# Altium schematic symbol library jlcpcb_2025_04_capacitors_extended_0402.schlib: 3594 symbols (part 7 of 20) (continued)
## C1005X7R471KGTS
designator C?  Capacitance: 470pF  (hidden comment: *)
Capacitor, Ceramic (MLCC), 470pF, ±10%, 50V, X7R, ±10%, SMD 0402; Manufacturer: Darfon Elec; Manufacturer Part Number: C1005X7R471KGTS; Package Size: 0402; JLCPCB Basic Part: No; JLCPCB Part Number: C147529; Supplier 1: LCSC; Category: Capacitors - MLCC; Supplier Part Number 1: C147529; Tolerance: ±10%; Voltage Rating: 50V; Temperature Coefficient: X7R; RoHS: Yes; ComponentLink1Description: Datasheet; ComponentLink1URL: https://wmsc.lcsc.com/wmsc/upload/file/pdf/v2/lcsc/2304140030_Darfon-Elec-C1005X7R471KGTS_C147529.pdf; ComponentLink2Description: JLCPCB Part URL; ComponentLink2URL: https://jlcpcb.com/partdetail/C147529; ComponentLink3Description: LCSC Part URL; ComponentLink3URL: https://lcsc.com/product-detail/Multilayer-Ceramic-Capacitors-MLCC---SMD-SMT_Darfon-Elec-Darfon-Elec-C1005X7R471KGTS_C147529.html
footprint CAP-0402 (0402 (1005M) Capacitor)
pins: 1, 2

## C1005X7R471MGTS
designator C?  Capacitance: 470pF  (hidden comment: *)
Capacitor, Ceramic (MLCC), 470pF, ±20%, 50V, X7R, ±20%, SMD 0402; Manufacturer: Darfon Elec; Manufacturer Part Number: C1005X7R471MGTS; Package Size: 0402; JLCPCB Basic Part: No; JLCPCB Part Number: C267420; Supplier 1: LCSC; Category: Capacitors - MLCC; Supplier Part Number 1: C267420; Tolerance: ±20%; Voltage Rating: 50V; Temperature Coefficient: X7R; RoHS: Yes; ComponentLink1Description: Datasheet; ComponentLink1URL: https://wmsc.lcsc.com/wmsc/upload/file/pdf/v2/lcsc/2304140030_Darfon-Elec-C1005X7R471MGTS_C267420.pdf; ComponentLink2Description: JLCPCB Part URL; ComponentLink2URL: https://jlcpcb.com/partdetail/C267420; ComponentLink3Description: LCSC Part URL; ComponentLink3URL: https://lcsc.com/product-detail/Multilayer-Ceramic-Capacitors-MLCC---SMD-SMT_Darfon-Elec-Darfon-Elec-C1005X7R471MGTS_C267420.html
footprint CAP-0402 (0402 (1005M) Capacitor)
pins: 1, 2

## C1005X7R472KGT
designator C?  Capacitance: 4.7nF  (hidden comment: *)
Capacitor, Ceramic (MLCC), 4.7nF, ±10%, 50V, X7R, ±10%, SMD 0402; Manufacturer: Darfon Elec; Manufacturer Part Number: C1005X7R472KGT; Package Size: 0402; JLCPCB Basic Part: No; JLCPCB Part Number: C424339; Supplier 1: LCSC; Category: Capacitors - MLCC; Supplier Part Number 1: C424339; Tolerance: ±10%; Voltage Rating: 50V; Temperature Coefficient: X7R; RoHS: Yes; ComponentLink1Description: Datasheet; ComponentLink1URL: https://wmsc.lcsc.com/wmsc/upload/file/pdf/v2/lcsc/2304140030_Darfon-Elec-C1005X7R472KGT_C424339.pdf; ComponentLink2Description: JLCPCB Part URL; ComponentLink2URL: https://jlcpcb.com/partdetail/C424339; ComponentLink3Description: LCSC Part URL; ComponentLink3URL: https://lcsc.com/product-detail/Multilayer-Ceramic-Capacitors-MLCC---SMD-SMT_Darfon-Elec-Darfon-Elec-C1005X7R472KGT_C424339.html
footprint CAP-0402 (0402 (1005M) Capacitor)
pins: 1, 2

## C1005X7R472KGTS
designator C?  Capacitance: 4.7nF  (hidden comment: *)
Capacitor, Ceramic (MLCC), 4.7nF, ±10%, 50V, X7R, ±10%, SMD 0402; Manufacturer: Darfon Elec; Manufacturer Part Number: C1005X7R472KGTS; Package Size: 0402; JLCPCB Basic Part: No; JLCPCB Part Number: C147583; Supplier 1: LCSC; Category: Capacitors - MLCC; Supplier Part Number 1: C147583; Tolerance: ±10%; Voltage Rating: 50V; Temperature Coefficient: X7R; RoHS: Yes; ComponentLink1Description: Datasheet; ComponentLink1URL: https://wmsc.lcsc.com/wmsc/upload/file/pdf/v2/lcsc/2304140030_Darfon-Elec-C1005X7R472KGTS_C147583.pdf; ComponentLink2Description: JLCPCB Part URL; ComponentLink2URL: https://jlcpcb.com/partdetail/C147583; ComponentLink3Description: LCSC Part URL; ComponentLink3URL: https://lcsc.com/product-detail/Multilayer-Ceramic-Capacitors-MLCC---SMD-SMT_Darfon-Elec-Darfon-Elec-C1005X7R472KGTS_C147583.html
footprint CAP-0402 (0402 (1005M) Capacitor)
pins: 1, 2

## C1005X7R472MGTS
designator C?  Capacitance: 4.7nF  (hidden comment: *)
Capacitor, Ceramic (MLCC), 4.7nF, ±20%, 50V, X7R, ±20%, SMD 0402; Manufacturer: Darfon Elec; Manufacturer Part Number: C1005X7R472MGTS; Package Size: 0402; JLCPCB Basic Part: No; JLCPCB Part Number: C267421; Supplier 1: LCSC; Category: Capacitors - MLCC; Supplier Part Number 1: C267421; Tolerance: ±20%; Voltage Rating: 50V; Temperature Coefficient: X7R; RoHS: Yes; ComponentLink1Description: Datasheet; ComponentLink1URL: https://wmsc.lcsc.com/wmsc/upload/file/pdf/v2/lcsc/1810241814_Darfon-Elec-C1005X7R472MGTS_C267421.pdf; ComponentLink2Description: JLCPCB Part URL; ComponentLink2URL: https://jlcpcb.com/partdetail/C267421; ComponentLink3Description: LCSC Part URL; ComponentLink3URL: https://lcsc.com/product-detail/Multilayer-Ceramic-Capacitors-MLCC---SMD-SMT_Darfon-Elec-Darfon-Elec-C1005X7R472MGTS_C267421.html
footprint CAP-0402 (0402 (1005M) Capacitor)
pins: 1, 2

## C1005X7R473KETS
designator C?  Capacitance: 47nF  (hidden comment: *)
Capacitor, Ceramic (MLCC), 47nF, ±10%, 16V, X7R, ±10%, SMD 0402; Manufacturer: Darfon Elec; Manufacturer Part Number: C1005X7R473KETS; Package Size: 0402; JLCPCB Basic Part: No; JLCPCB Part Number: C147628; Supplier 1: LCSC; Category: Capacitors - MLCC; Supplier Part Number 1: C147628; Tolerance: ±10%; Voltage Rating: 16V; Temperature Coefficient: X7R; RoHS: Yes; ComponentLink1Description: Datasheet; ComponentLink1URL: https://wmsc.lcsc.com/wmsc/upload/file/pdf/v2/lcsc/2304140030_Darfon-Elec-C1005X7R473KETS_C147628.pdf; ComponentLink2Description: JLCPCB Part URL; ComponentLink2URL: https://jlcpcb.com/partdetail/C147628; ComponentLink3Description: LCSC Part URL; ComponentLink3URL: https://lcsc.com/product-detail/Multilayer-Ceramic-Capacitors-MLCC---SMD-SMT_Darfon-Elec-Darfon-Elec-C1005X7R473KETS_C147628.html
footprint CAP-0402 (0402 (1005M) Capacitor)
pins: 1, 2

## C1005X7R473METS
designator C?  Capacitance: 47nF  (hidden comment: *)
Capacitor, Ceramic (MLCC), 47nF, ±20%, 16V, X7R, ±20%, SMD 0402; Manufacturer: Darfon Elec; Manufacturer Part Number: C1005X7R473METS; Package Size: 0402; JLCPCB Basic Part: No; JLCPCB Part Number: C312032; Supplier 1: LCSC; Category: Capacitors - MLCC; Supplier Part Number 1: C312032; Tolerance: ±20%; Voltage Rating: 16V; Temperature Coefficient: X7R; RoHS: Yes; ComponentLink1Description: Datasheet; ComponentLink1URL: https://wmsc.lcsc.com/wmsc/upload/file/pdf/v2/lcsc/2304140030_Darfon-Elec-C1005X7R473METS_C312032.pdf; ComponentLink2Description: JLCPCB Part URL; ComponentLink2URL: https://jlcpcb.com/partdetail/C312032; ComponentLink3Description: LCSC Part URL; ComponentLink3URL: https://lcsc.com/product-detail/Multilayer-Ceramic-Capacitors-MLCC---SMD-SMT_Darfon-Elec-Darfon-Elec-C1005X7R473METS_C312032.html
footprint CAP-0402 (0402 (1005M) Capacitor)
pins: 1, 2

## C1005X7R473MFTS
designator C?  Capacitance: 47nF  (hidden comment: *)
Capacitor, Ceramic (MLCC), 47nF, ±20%, 25V, X7R, ±20%, SMD 0402; Manufacturer: Darfon Elec; Manufacturer Part Number: C1005X7R473MFTS; Package Size: 0402; JLCPCB Basic Part: No; JLCPCB Part Number: C311886; Supplier 1: LCSC; Category: Capacitors - MLCC; Supplier Part Number 1: C311886; Tolerance: ±20%; Voltage Rating: 25V; Temperature Coefficient: X7R; RoHS: Yes; ComponentLink1Description: Datasheet; ComponentLink1URL: https://wmsc.lcsc.com/wmsc/upload/file/pdf/v2/lcsc/2304140030_Darfon-Elec-C1005X7R473MFTS_C311886.pdf; ComponentLink2Description: JLCPCB Part URL; ComponentLink2URL: https://jlcpcb.com/partdetail/C311886; ComponentLink3Description: LCSC Part URL; ComponentLink3URL: https://lcsc.com/product-detail/Multilayer-Ceramic-Capacitors-MLCC---SMD-SMT_Darfon-Elec-Darfon-Elec-C1005X7R473MFTS_C311886.html
footprint CAP-0402 (0402 (1005M) Capacitor)
pins: 1, 2

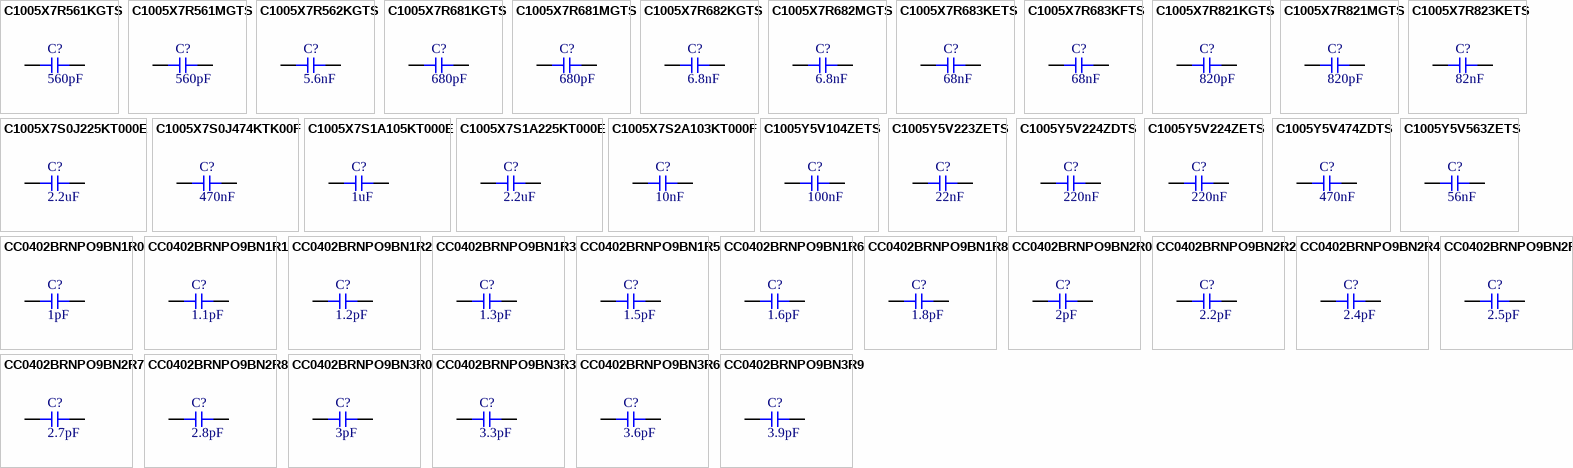
[diagram p29: symbols C1005X7R561KGTS to CC0402BRNPO9BN3R9]

## C1005X7R561KGTS
designator C?  Capacitance: 560pF  (hidden comment: *)
Capacitor, Ceramic (MLCC), 560pF, ±10%, 50V, X7R, ±10%, SMD 0402; Manufacturer: Darfon Elec; Manufacturer Part Number: C1005X7R561KGTS; Package Size: 0402; JLCPCB Basic Part: No; JLCPCB Part Number: C147533; Supplier 1: LCSC; Category: Capacitors - MLCC; Supplier Part Number 1: C147533; Tolerance: ±10%; Voltage Rating: 50V; Temperature Coefficient: X7R; RoHS: Yes; ComponentLink1Description: Datasheet; ComponentLink1URL: https://wmsc.lcsc.com/wmsc/upload/file/pdf/v2/lcsc/2304140030_Darfon-Elec-C1005X7R561KGTS_C147533.pdf; ComponentLink2Description: JLCPCB Part URL; ComponentLink2URL: https://jlcpcb.com/partdetail/C147533; ComponentLink3Description: LCSC Part URL; ComponentLink3URL: https://lcsc.com/product-detail/Multilayer-Ceramic-Capacitors-MLCC---SMD-SMT_Darfon-Elec-Darfon-Elec-C1005X7R561KGTS_C147533.html
footprint CAP-0402 (0402 (1005M) Capacitor)
pins: 1, 2

## C1005X7R561MGTS
designator C?  Capacitance: 560pF  (hidden comment: *)
Capacitor, Ceramic (MLCC), 560pF, ±20%, 50V, X7R, ±20%, SMD 0402; Manufacturer: Darfon Elec; Manufacturer Part Number: C1005X7R561MGTS; Package Size: 0402; JLCPCB Basic Part: No; JLCPCB Part Number: C311874; Supplier 1: LCSC; Category: Capacitors - MLCC; Supplier Part Number 1: C311874; Tolerance: ±20%; Voltage Rating: 50V; Temperature Coefficient: X7R; RoHS: Yes; ComponentLink1Description: Datasheet; ComponentLink1URL: https://wmsc.lcsc.com/wmsc/upload/file/pdf/v2/lcsc/2304140030_Darfon-Elec-C1005X7R561MGTS_C311874.pdf; ComponentLink2Description: JLCPCB Part URL; ComponentLink2URL: https://jlcpcb.com/partdetail/C311874; ComponentLink3Description: LCSC Part URL; ComponentLink3URL: https://lcsc.com/product-detail/Multilayer-Ceramic-Capacitors-MLCC---SMD-SMT_Darfon-Elec-Darfon-Elec-C1005X7R561MGTS_C311874.html
footprint CAP-0402 (0402 (1005M) Capacitor)
pins: 1, 2

## C1005X7R562KGTS
designator C?  Capacitance: 5.6nF  (hidden comment: *)
Capacitor, Ceramic (MLCC), 5.6nF, ±10%, 50V, X7R, ±10%, SMD 0402; Manufacturer: Darfon Elec; Manufacturer Part Number: C1005X7R562KGTS; Package Size: 0402; JLCPCB Basic Part: No; JLCPCB Part Number: C147587; Supplier 1: LCSC; Category: Capacitors - MLCC; Supplier Part Number 1: C147587; Tolerance: ±10%; Voltage Rating: 50V; Temperature Coefficient: X7R; RoHS: Yes; ComponentLink1Description: Datasheet; ComponentLink1URL: https://wmsc.lcsc.com/wmsc/upload/file/pdf/v2/lcsc/2304140030_Darfon-Elec-C1005X7R562KGTS_C147587.pdf; ComponentLink2Description: JLCPCB Part URL; ComponentLink2URL: https://jlcpcb.com/partdetail/C147587; ComponentLink3Description: LCSC Part URL; ComponentLink3URL: https://lcsc.com/product-detail/Multilayer-Ceramic-Capacitors-MLCC---SMD-SMT_Darfon-Elec-Darfon-Elec-C1005X7R562KGTS_C147587.html
footprint CAP-0402 (0402 (1005M) Capacitor)
pins: 1, 2

## C1005X7R681KGTS
designator C?  Capacitance: 680pF  (hidden comment: *)
Capacitor, Ceramic (MLCC), 680pF, ±10%, 50V, X7R, ±10%, SMD 0402; Manufacturer: Darfon Elec; Manufacturer Part Number: C1005X7R681KGTS; Package Size: 0402; JLCPCB Basic Part: No; JLCPCB Part Number: C147537; Supplier 1: LCSC; Category: Capacitors - MLCC; Supplier Part Number 1: C147537; Tolerance: ±10%; Voltage Rating: 50V; Temperature Coefficient: X7R; RoHS: Yes; ComponentLink1Description: Datasheet; ComponentLink1URL: https://wmsc.lcsc.com/wmsc/upload/file/pdf/v2/lcsc/2304140030_Darfon-Elec-C1005X7R681KGTS_C147537.pdf; ComponentLink2Description: JLCPCB Part URL; ComponentLink2URL: https://jlcpcb.com/partdetail/C147537; ComponentLink3Description: LCSC Part URL; ComponentLink3URL: https://lcsc.com/product-detail/Multilayer-Ceramic-Capacitors-MLCC---SMD-SMT_Darfon-Elec-Darfon-Elec-C1005X7R681KGTS_C147537.html
footprint CAP-0402 (0402 (1005M) Capacitor)
pins: 1, 2

## C1005X7R681MGTS
designator C?  Capacitance: 680pF  (hidden comment: *)
Capacitor, Ceramic (MLCC), 680pF, ±20%, 50V, X7R, ±20%, SMD 0402; Manufacturer: Darfon Elec; Manufacturer Part Number: C1005X7R681MGTS; Package Size: 0402; JLCPCB Basic Part: No; JLCPCB Part Number: C311864; Supplier 1: LCSC; Category: Capacitors - MLCC; Supplier Part Number 1: C311864; Tolerance: ±20%; Voltage Rating: 50V; Temperature Coefficient: X7R; RoHS: Yes; ComponentLink1Description: Datasheet; ComponentLink1URL: https://wmsc.lcsc.com/wmsc/upload/file/pdf/v2/lcsc/2304140030_Darfon-Elec-C1005X7R681MGTS_C311864.pdf; ComponentLink2Description: JLCPCB Part URL; ComponentLink2URL: https://jlcpcb.com/partdetail/C311864; ComponentLink3Description: LCSC Part URL; ComponentLink3URL: https://lcsc.com/product-detail/Multilayer-Ceramic-Capacitors-MLCC---SMD-SMT_Darfon-Elec-Darfon-Elec-C1005X7R681MGTS_C311864.html
footprint CAP-0402 (0402 (1005M) Capacitor)
pins: 1, 2

## C1005X7R682KGTS
designator C?  Capacitance: 6.8nF  (hidden comment: *)
Capacitor, Ceramic (MLCC), 6.8nF, ±10%, 50V, X7R, ±10%, SMD 0402; Manufacturer: Darfon Elec; Manufacturer Part Number: C1005X7R682KGTS; Package Size: 0402; JLCPCB Basic Part: No; JLCPCB Part Number: C147591; Supplier 1: LCSC; Category: Capacitors - MLCC; Supplier Part Number 1: C147591; Tolerance: ±10%; Voltage Rating: 50V; Temperature Coefficient: X7R; RoHS: Yes; ComponentLink1Description: Datasheet; ComponentLink1URL: https://wmsc.lcsc.com/wmsc/upload/file/pdf/v2/lcsc/2304140030_Darfon-Elec-C1005X7R682KGTS_C147591.pdf; ComponentLink2Description: JLCPCB Part URL; ComponentLink2URL: https://jlcpcb.com/partdetail/C147591; ComponentLink3Description: LCSC Part URL; ComponentLink3URL: https://lcsc.com/product-detail/Multilayer-Ceramic-Capacitors-MLCC---SMD-SMT_Darfon-Elec-Darfon-Elec-C1005X7R682KGTS_C147591.html
footprint CAP-0402 (0402 (1005M) Capacitor)
pins: 1, 2

## C1005X7R682MGTS
designator C?  Capacitance: 6.8nF  (hidden comment: *)
Capacitor, Ceramic (MLCC), 6.8nF, ±20%, 50V, X7R, ±20%, SMD 0402; Manufacturer: Darfon Elec; Manufacturer Part Number: C1005X7R682MGTS; Package Size: 0402; JLCPCB Basic Part: No; JLCPCB Part Number: C267422; Supplier 1: LCSC; Category: Capacitors - MLCC; Supplier Part Number 1: C267422; Tolerance: ±20%; Voltage Rating: 50V; Temperature Coefficient: X7R; RoHS: Yes; ComponentLink1Description: Datasheet; ComponentLink1URL: https://wmsc.lcsc.com/wmsc/upload/file/pdf/v2/lcsc/2304140030_Darfon-Elec-C1005X7R682MGTS_C267422.pdf; ComponentLink2Description: JLCPCB Part URL; ComponentLink2URL: https://jlcpcb.com/partdetail/C267422; ComponentLink3Description: LCSC Part URL; ComponentLink3URL: https://lcsc.com/product-detail/Multilayer-Ceramic-Capacitors-MLCC---SMD-SMT_Darfon-Elec-Darfon-Elec-C1005X7R682MGTS_C267422.html
footprint CAP-0402 (0402 (1005M) Capacitor)
pins: 1, 2

## C1005X7R683KETS
designator C?  Capacitance: 68nF  (hidden comment: *)
Capacitor, Ceramic (MLCC), 68nF, ±10%, 16V, X7R, ±10%, SMD 0402; Manufacturer: Darfon Elec; Manufacturer Part Number: C1005X7R683KETS; Package Size: 0402; JLCPCB Basic Part: No; JLCPCB Part Number: C147635; Supplier 1: LCSC; Category: Capacitors - MLCC; Supplier Part Number 1: C147635; Tolerance: ±10%; Voltage Rating: 16V; Temperature Coefficient: X7R; RoHS: Yes; ComponentLink1Description: Datasheet; ComponentLink1URL: https://wmsc.lcsc.com/wmsc/upload/file/pdf/v2/lcsc/2304140030_Darfon-Elec-C1005X7R683KETS_C147635.pdf; ComponentLink2Description: JLCPCB Part URL; ComponentLink2URL: https://jlcpcb.com/partdetail/C147635; ComponentLink3Description: LCSC Part URL; ComponentLink3URL: https://lcsc.com/product-detail/Multilayer-Ceramic-Capacitors-MLCC---SMD-SMT_Darfon-Elec-Darfon-Elec-C1005X7R683KETS_C147635.html
footprint CAP-0402 (0402 (1005M) Capacitor)
pins: 1, 2

## C1005X7R683KFTS
designator C?  Capacitance: 68nF  (hidden comment: *)
Capacitor, Ceramic (MLCC), 68nF, ±10%, 25V, X7R, ±10%, SMD 0402; Manufacturer: Darfon Elec; Manufacturer Part Number: C1005X7R683KFTS; Package Size: 0402; JLCPCB Basic Part: No; JLCPCB Part Number: C359307; Supplier 1: LCSC; Category: Capacitors - MLCC; Supplier Part Number 1: C359307; Tolerance: ±10%; Voltage Rating: 25V; Temperature Coefficient: X7R; RoHS: Yes; ComponentLink1Description: Datasheet; ComponentLink1URL: https://wmsc.lcsc.com/wmsc/upload/file/pdf/v2/lcsc/2304140030_Darfon-Elec-C1005X7R683KFTS_C359307.pdf; ComponentLink2Description: JLCPCB Part URL; ComponentLink2URL: https://jlcpcb.com/partdetail/C359307; ComponentLink3Description: LCSC Part URL; ComponentLink3URL: https://lcsc.com/product-detail/Multilayer-Ceramic-Capacitors-MLCC---SMD-SMT_Darfon-Elec-Darfon-Elec-C1005X7R683KFTS_C359307.html
footprint CAP-0402 (0402 (1005M) Capacitor)
pins: 1, 2

## C1005X7R821KGTS
designator C?  Capacitance: 820pF  (hidden comment: *)
Capacitor, Ceramic (MLCC), 820pF, ±10%, 50V, X7R, ±10%, SMD 0402; Manufacturer: Darfon Elec; Manufacturer Part Number: C1005X7R821KGTS; Package Size: 0402; JLCPCB Basic Part: No; JLCPCB Part Number: C147541; Supplier 1: LCSC; Category: Capacitors - MLCC; Supplier Part Number 1: C147541; Tolerance: ±10%; Voltage Rating: 50V; Temperature Coefficient: X7R; RoHS: Yes; ComponentLink1Description: Datasheet; ComponentLink1URL: https://wmsc.lcsc.com/wmsc/upload/file/pdf/v2/lcsc/2304140030_Darfon-Elec-C1005X7R821KGTS_C147541.pdf; ComponentLink2Description: JLCPCB Part URL; ComponentLink2URL: https://jlcpcb.com/partdetail/C147541; ComponentLink3Description: LCSC Part URL; ComponentLink3URL: https://lcsc.com/product-detail/Multilayer-Ceramic-Capacitors-MLCC---SMD-SMT_Darfon-Elec-Darfon-Elec-C1005X7R821KGTS_C147541.html
footprint CAP-0402 (0402 (1005M) Capacitor)
pins: 1, 2

## C1005X7R821MGTS
designator C?  Capacitance: 820pF  (hidden comment: *)
Capacitor, Ceramic (MLCC), 820pF, ±20%, 50V, X7R, ±20%, SMD 0402; Manufacturer: Darfon Elec; Manufacturer Part Number: C1005X7R821MGTS; Package Size: 0402; JLCPCB Basic Part: No; JLCPCB Part Number: C311844; Supplier 1: LCSC; Category: Capacitors - MLCC; Supplier Part Number 1: C311844; Tolerance: ±20%; Voltage Rating: 50V; Temperature Coefficient: X7R; RoHS: Yes; ComponentLink1Description: Datasheet; ComponentLink1URL: https://wmsc.lcsc.com/wmsc/upload/file/pdf/v2/lcsc/2304140030_Darfon-Elec-C1005X7R821MGTS_C311844.pdf; ComponentLink2Description: JLCPCB Part URL; ComponentLink2URL: https://jlcpcb.com/partdetail/C311844; ComponentLink3Description: LCSC Part URL; ComponentLink3URL: https://lcsc.com/product-detail/Multilayer-Ceramic-Capacitors-MLCC---SMD-SMT_Darfon-Elec-Darfon-Elec-C1005X7R821MGTS_C311844.html
footprint CAP-0402 (0402 (1005M) Capacitor)
pins: 1, 2

## C1005X7R823KETS
designator C?  Capacitance: 82nF  (hidden comment: *)
Capacitor, Ceramic (MLCC), 82nF, ±10%, 16V, X7R, ±10%, SMD 0402; Manufacturer: Darfon Elec; Manufacturer Part Number: C1005X7R823KETS; Package Size: 0402; JLCPCB Basic Part: No; JLCPCB Part Number: C147637; Supplier 1: LCSC; Category: Capacitors - MLCC; Supplier Part Number 1: C147637; Tolerance: ±10%; Voltage Rating: 16V; Temperature Coefficient: X7R; RoHS: Yes; ComponentLink1Description: Datasheet; ComponentLink1URL: https://wmsc.lcsc.com/wmsc/upload/file/pdf/v2/lcsc/2304140030_Darfon-Elec-C1005X7R823KETS_C147637.pdf; ComponentLink2Description: JLCPCB Part URL; ComponentLink2URL: https://jlcpcb.com/partdetail/C147637; ComponentLink3Description: LCSC Part URL; ComponentLink3URL: https://lcsc.com/product-detail/Multilayer-Ceramic-Capacitors-MLCC---SMD-SMT_Darfon-Elec-Darfon-Elec-C1005X7R823KETS_C147637.html
footprint CAP-0402 (0402 (1005M) Capacitor)
pins: 1, 2

## C1005X7S0J225KT000E
designator C?  Capacitance: 2.2uF  (hidden comment: *)
Capacitor, Ceramic (MLCC), 2.2uF, ±10%, 6.3V, X7S, ±10%, SMD 0402; Manufacturer: TDK; Manufacturer Part Number: C1005X7S0J225KT000E; Package Size: 0402; JLCPCB Basic Part: No; JLCPCB Part Number: C338067; Supplier 1: LCSC; Category: Capacitors - MLCC; Supplier Part Number 1: C338067; Tolerance: ±10%; Voltage Rating: 6.3V; Temperature Coefficient: X7S; RoHS: Yes; ComponentLink1Description: Datasheet; ComponentLink1URL: https://wmsc.lcsc.com/wmsc/upload/file/pdf/v2/lcsc/2304140030_TDK-C1005X7S0J225KT000E_C338067.pdf; ComponentLink2Description: JLCPCB Part URL; ComponentLink2URL: https://jlcpcb.com/partdetail/C338067; ComponentLink3Description: LCSC Part URL; ComponentLink3URL: https://lcsc.com/product-detail/Multilayer-Ceramic-Capacitors-MLCC---SMD-SMT_TDK-TDK-C1005X7S0J225KT000E_C338067.html
footprint CAP-0402 (0402 (1005M) Capacitor)
pins: 1, 2

## C1005X7S0J474KTK00F
designator C?  Capacitance: 470nF  (hidden comment: *)
Capacitor, Ceramic (MLCC), 470nF, ±10%, 6.3V, X7S, ±10%, SMD 0402; Manufacturer: TDK; Manufacturer Part Number: C1005X7S0J474KTK00F; Package Size: 0402; JLCPCB Basic Part: No; JLCPCB Part Number: C694173; Supplier 1: LCSC; Category: Capacitors - MLCC; Supplier Part Number 1: C694173; Tolerance: ±10%; Voltage Rating: 6.3V; Temperature Coefficient: X7S; RoHS: Yes; ComponentLink1Description: Datasheet; ComponentLink1URL: https://wmsc.lcsc.com/wmsc/upload/file/pdf/v2/lcsc/2304140030_TDK-C1005X7S0J474KTK00F_C694173.pdf; ComponentLink2Description: JLCPCB Part URL; ComponentLink2URL: https://jlcpcb.com/partdetail/C694173; ComponentLink3Description: LCSC Part URL; ComponentLink3URL: https://lcsc.com/product-detail/Multilayer-Ceramic-Capacitors-MLCC---SMD-SMT_TDK-TDK-C1005X7S0J474KTK00F_C694173.html
footprint CAP-0402 (0402 (1005M) Capacitor)
pins: 1, 2

## C1005X7S1A105KT000E
designator C?  Capacitance: 1uF  (hidden comment: *)
Capacitor, Ceramic (MLCC), 1uF, ±10%, 10V, X7S, ±10%, SMD 0402; Manufacturer: TDK; Manufacturer Part Number: C1005X7S1A105KT000E; Package Size: 0402; JLCPCB Basic Part: No; JLCPCB Part Number: C393027; Supplier 1: LCSC; Category: Capacitors - MLCC; Supplier Part Number 1: C393027; Tolerance: ±10%; Voltage Rating: 10V; Temperature Coefficient: X7S; RoHS: Yes; ComponentLink1Description: Datasheet; ComponentLink1URL: https://wmsc.lcsc.com/wmsc/upload/file/pdf/v2/lcsc/2304140030_TDK-C1005X7S1A105KT000E_C393027.pdf; ComponentLink2Description: JLCPCB Part URL; ComponentLink2URL: https://jlcpcb.com/partdetail/C393027; ComponentLink3Description: LCSC Part URL; ComponentLink3URL: https://lcsc.com/product-detail/Multilayer-Ceramic-Capacitors-MLCC---SMD-SMT_TDK-TDK-C1005X7S1A105KT000E_C393027.html
footprint CAP-0402 (0402 (1005M) Capacitor)
pins: 1, 2

## C1005X7S1A225KT000E
designator C?  Capacitance: 2.2uF  (hidden comment: *)
Capacitor, Ceramic (MLCC), 2.2uF, ±10%, 10V, X7S, ±10%, SMD 0402; Manufacturer: TDK; Manufacturer Part Number: C1005X7S1A225KT000E; Package Size: 0402; JLCPCB Basic Part: No; JLCPCB Part Number: C445740; Supplier 1: LCSC; Category: Capacitors - MLCC; Supplier Part Number 1: C445740; Tolerance: ±10%; Voltage Rating: 10V; Temperature Coefficient: X7S; RoHS: Yes; ComponentLink1Description: Datasheet; ComponentLink1URL: https://wmsc.lcsc.com/wmsc/upload/file/pdf/v2/lcsc/2304140030_TDK-C1005X7S1A225KT000E_C445740.pdf; ComponentLink2Description: JLCPCB Part URL; ComponentLink2URL: https://jlcpcb.com/partdetail/C445740; ComponentLink3Description: LCSC Part URL; ComponentLink3URL: https://lcsc.com/product-detail/Multilayer-Ceramic-Capacitors-MLCC---SMD-SMT_TDK-TDK-C1005X7S1A225KT000E_C445740.html
footprint CAP-0402 (0402 (1005M) Capacitor)
pins: 1, 2

## C1005X7S2A103KT000F
designator C?  Capacitance: 10nF  (hidden comment: *)
Capacitor, Ceramic (MLCC), 10nF, ±10%, 100V, X7S, ±10%, SMD 0402; Manufacturer: TDK; Manufacturer Part Number: C1005X7S2A103KT000F; Package Size: 0402; JLCPCB Basic Part: No; JLCPCB Part Number: C343046; Supplier 1: LCSC; Category: Capacitors - MLCC; Supplier Part Number 1: C343046; Tolerance: ±10%; Voltage Rating: 100V; Temperature Coefficient: X7S; RoHS: Yes; ComponentLink1Description: Datasheet; ComponentLink1URL: https://wmsc.lcsc.com/wmsc/upload/file/pdf/v2/lcsc/2304140030_TDK-C1005X7S2A103KT000F_C343046.pdf; ComponentLink2Description: JLCPCB Part URL; ComponentLink2URL: https://jlcpcb.com/partdetail/C343046; ComponentLink3Description: LCSC Part URL; ComponentLink3URL: https://lcsc.com/product-detail/Multilayer-Ceramic-Capacitors-MLCC---SMD-SMT_TDK-TDK-C1005X7S2A103KT000F_C343046.html
footprint CAP-0402 (0402 (1005M) Capacitor)
pins: 1, 2

## C1005Y5V104ZETS
designator C?  Capacitance: 100nF  (hidden comment: *)
Capacitor, Ceramic (MLCC), 100nF, 16V, Y5V, SMD 0402; Manufacturer: Darfon Elec; Manufacturer Part Number: C1005Y5V104ZETS; Temperature Rating: -20%~+80%; Package Size: 0402; JLCPCB Basic Part: No; JLCPCB Part Number: C312123; Supplier 1: LCSC; Category: Capacitors - MLCC; Supplier Part Number 1: C312123; Voltage Rating: 16V; Temperature Coefficient: Y5V; RoHS: Yes; ComponentLink1Description: Datasheet; ComponentLink1URL: https://wmsc.lcsc.com/wmsc/upload/file/pdf/v2/lcsc/2304140030_Darfon-Elec-C1005Y5V104ZETS_C312123.pdf; ComponentLink2Description: JLCPCB Part URL; ComponentLink2URL: https://jlcpcb.com/partdetail/C312123; ComponentLink3Description: LCSC Part URL; ComponentLink3URL: https://lcsc.com/product-detail/Multilayer-Ceramic-Capacitors-MLCC---SMD-SMT_Darfon-Elec-Darfon-Elec-C1005Y5V104ZETS_C312123.html
footprint CAP-0402 (0402 (1005M) Capacitor)
pins: 1, 2

## C1005Y5V223ZETS
designator C?  Capacitance: 22nF  (hidden comment: *)
Capacitor, Ceramic (MLCC), 22nF, 16V, Y5V, SMD 0402; Manufacturer: Darfon Elec; Manufacturer Part Number: C1005Y5V223ZETS; Temperature Rating: -20%~+80%; Package Size: 0402; JLCPCB Basic Part: No; JLCPCB Part Number: C312079; Supplier 1: LCSC; Category: Capacitors - MLCC; Supplier Part Number 1: C312079; Voltage Rating: 16V; Temperature Coefficient: Y5V; RoHS: Yes; ComponentLink1Description: Datasheet; ComponentLink1URL: https://wmsc.lcsc.com/wmsc/upload/file/pdf/v2/lcsc/2304140030_Darfon-Elec-C1005Y5V223ZETS_C312079.pdf; ComponentLink2Description: JLCPCB Part URL; ComponentLink2URL: https://jlcpcb.com/partdetail/C312079; ComponentLink3Description: LCSC Part URL; ComponentLink3URL: https://lcsc.com/product-detail/Multilayer-Ceramic-Capacitors-MLCC---SMD-SMT_Darfon-Elec-Darfon-Elec-C1005Y5V223ZETS_C312079.html
footprint CAP-0402 (0402 (1005M) Capacitor)
pins: 1, 2

## C1005Y5V224ZDTS
designator C?  Capacitance: 220nF  (hidden comment: *)
Capacitor, Ceramic (MLCC), 220nF, 10V, Y5V, SMD 0402; Manufacturer: Darfon Elec; Manufacturer Part Number: C1005Y5V224ZDTS; Temperature Rating: -20%~+80%; Package Size: 0402; JLCPCB Basic Part: No; JLCPCB Part Number: C147756; Supplier 1: LCSC; Category: Capacitors - MLCC; Supplier Part Number 1: C147756; Voltage Rating: 10V; Temperature Coefficient: Y5V; RoHS: Yes; ComponentLink1Description: Datasheet; ComponentLink1URL: https://wmsc.lcsc.com/wmsc/upload/file/pdf/v2/lcsc/2304140030_Darfon-Elec-C1005Y5V224ZDTS_C147756.pdf; ComponentLink2Description: JLCPCB Part URL; ComponentLink2URL: https://jlcpcb.com/partdetail/C147756; ComponentLink3Description: LCSC Part URL; ComponentLink3URL: https://lcsc.com/product-detail/Multilayer-Ceramic-Capacitors-MLCC---SMD-SMT_Darfon-Elec-Darfon-Elec-C1005Y5V224ZDTS_C147756.html
footprint CAP-0402 (0402 (1005M) Capacitor)
pins: 1, 2

## C1005Y5V224ZETS
designator C?  Capacitance: 220nF  (hidden comment: *)
Capacitor, Ceramic (MLCC), 220nF, 16V, Y5V, SMD 0402; Manufacturer: Darfon Elec; Manufacturer Part Number: C1005Y5V224ZETS; Temperature Rating: -20%~+80%; Package Size: 0402; JLCPCB Basic Part: No; JLCPCB Part Number: C147755; Supplier 1: LCSC; Category: Capacitors - MLCC; Supplier Part Number 1: C147755; Voltage Rating: 16V; Temperature Coefficient: Y5V; RoHS: Yes; ComponentLink1Description: Datasheet; ComponentLink1URL: https://wmsc.lcsc.com/wmsc/upload/file/pdf/v2/lcsc/2304140030_Darfon-Elec-C1005Y5V224ZETS_C147755.pdf; ComponentLink2Description: JLCPCB Part URL; ComponentLink2URL: https://jlcpcb.com/partdetail/C147755; ComponentLink3Description: LCSC Part URL; ComponentLink3URL: https://lcsc.com/product-detail/Multilayer-Ceramic-Capacitors-MLCC---SMD-SMT_Darfon-Elec-Darfon-Elec-C1005Y5V224ZETS_C147755.html
footprint CAP-0402 (0402 (1005M) Capacitor)
pins: 1, 2

## C1005Y5V474ZDTS
designator C?  Capacitance: 470nF  (hidden comment: *)
Capacitor, Ceramic (MLCC), 470nF, 10V, Y5V, SMD 0402; Manufacturer: Darfon Elec; Manufacturer Part Number: C1005Y5V474ZDTS; Temperature Rating: -20%~+80%; Package Size: 0402; JLCPCB Basic Part: No; JLCPCB Part Number: C147759; Supplier 1: LCSC; Category: Capacitors - MLCC; Supplier Part Number 1: C147759; Voltage Rating: 10V; Temperature Coefficient: Y5V; RoHS: Yes; ComponentLink1Description: Datasheet; ComponentLink1URL: https://wmsc.lcsc.com/wmsc/upload/file/pdf/v2/lcsc/2304140030_Darfon-Elec-C1005Y5V474ZDTS_C147759.pdf; ComponentLink2Description: JLCPCB Part URL; ComponentLink2URL: https://jlcpcb.com/partdetail/C147759; ComponentLink3Description: LCSC Part URL; ComponentLink3URL: https://lcsc.com/product-detail/Multilayer-Ceramic-Capacitors-MLCC---SMD-SMT_Darfon-Elec-Darfon-Elec-C1005Y5V474ZDTS_C147759.html
footprint CAP-0402 (0402 (1005M) Capacitor)
pins: 1, 2

## C1005Y5V563ZETS
designator C?  Capacitance: 56nF  (hidden comment: *)
Capacitor, Ceramic (MLCC), 56nF, 16V, Y5V, SMD 0402; Manufacturer: Darfon Elec; Manufacturer Part Number: C1005Y5V563ZETS; Temperature Rating: -20%~+80%; Package Size: 0402; JLCPCB Basic Part: No; JLCPCB Part Number: C311873; Supplier 1: LCSC; Category: Capacitors - MLCC; Supplier Part Number 1: C311873; Voltage Rating: 16V; Temperature Coefficient: Y5V; RoHS: Yes; ComponentLink1Description: Datasheet; ComponentLink1URL: https://wmsc.lcsc.com/wmsc/upload/file/pdf/v2/lcsc/2304140030_Darfon-Elec-C1005Y5V563ZETS_C311873.pdf; ComponentLink2Description: JLCPCB Part URL; ComponentLink2URL: https://jlcpcb.com/partdetail/C311873; ComponentLink3Description: LCSC Part URL; ComponentLink3URL: https://lcsc.com/product-detail/Multilayer-Ceramic-Capacitors-MLCC---SMD-SMT_Darfon-Elec-Darfon-Elec-C1005Y5V563ZETS_C311873.html
footprint CAP-0402 (0402 (1005M) Capacitor)
pins: 1, 2

## CC0402BRNPO9BN1R0
designator C?  Capacitance: 1pF  (hidden comment: *)
Capacitor, Ceramic (MLCC), 1pF, 50V, NP0, SMD 0402; Manufacturer: YAGEO; Manufacturer Part Number: CC0402BRNPO9BN1R0; Package Size: 0402; JLCPCB Basic Part: No; JLCPCB Part Number: C309455; Supplier 1: LCSC; Category: Capacitors - MLCC; Supplier Part Number 1: C309455; Voltage Rating: 50V; Temperature Coefficient: NP0; RoHS: Yes; ComponentLink1Description: Datasheet; ComponentLink1URL: https://wmsc.lcsc.com/wmsc/upload/file/pdf/v2/lcsc/2304140030_YAGEO-CC0402BRNPO9BN1R0_C309455.pdf; ComponentLink2Description: JLCPCB Part URL; ComponentLink2URL: https://jlcpcb.com/partdetail/C309455; ComponentLink3Description: LCSC Part URL; ComponentLink3URL: https://lcsc.com/product-detail/Multilayer-Ceramic-Capacitors-MLCC---SMD-SMT_YAGEO-YAGEO-CC0402BRNPO9BN1R0_C309455.html
footprint CAP-0402 (0402 (1005M) Capacitor)
pins: 1, 2

## CC0402BRNPO9BN1R1
designator C?  Capacitance: 1.1pF  (hidden comment: *)
Capacitor, Ceramic (MLCC), 1.1pF, 50V, NP0, SMD 0402; Manufacturer: YAGEO; Manufacturer Part Number: CC0402BRNPO9BN1R1; Package Size: 0402; JLCPCB Basic Part: No; JLCPCB Part Number: C541332; Supplier 1: LCSC; Category: Capacitors - MLCC; Supplier Part Number 1: C541332; Voltage Rating: 50V; Temperature Coefficient: NP0; RoHS: Yes; ComponentLink1Description: Datasheet; ComponentLink1URL: https://wmsc.lcsc.com/wmsc/upload/file/pdf/v2/lcsc/2006151111_YAGEO-CC0402BRNPO9BN1R1_C541332.pdf; ComponentLink2Description: JLCPCB Part URL; ComponentLink2URL: https://jlcpcb.com/partdetail/C541332; ComponentLink3Description: LCSC Part URL; ComponentLink3URL: https://lcsc.com/product-detail/Multilayer-Ceramic-Capacitors-MLCC---SMD-SMT_YAGEO-YAGEO-CC0402BRNPO9BN1R1_C541332.html
footprint CAP-0402 (0402 (1005M) Capacitor)
pins: 1, 2

## CC0402BRNPO9BN1R2
designator C?  Capacitance: 1.2pF  (hidden comment: *)
Capacitor, Ceramic (MLCC), 1.2pF, 50V, NP0, SMD 0402; Manufacturer: YAGEO; Manufacturer Part Number: CC0402BRNPO9BN1R2; Package Size: 0402; JLCPCB Basic Part: No; JLCPCB Part Number: C327292; Supplier 1: LCSC; Category: Capacitors - MLCC; Supplier Part Number 1: C327292; Voltage Rating: 50V; Temperature Coefficient: NP0; RoHS: Yes; ComponentLink1Description: Datasheet; ComponentLink1URL: https://wmsc.lcsc.com/wmsc/upload/file/pdf/v2/lcsc/2304140030_YAGEO-CC0402BRNPO9BN1R2_C327292.pdf; ComponentLink2Description: JLCPCB Part URL; ComponentLink2URL: https://jlcpcb.com/partdetail/C327292; ComponentLink3Description: LCSC Part URL; ComponentLink3URL: https://lcsc.com/product-detail/Multilayer-Ceramic-Capacitors-MLCC---SMD-SMT_YAGEO-YAGEO-CC0402BRNPO9BN1R2_C327292.html
footprint CAP-0402 (0402 (1005M) Capacitor)
pins: 1, 2

## CC0402BRNPO9BN1R3
designator C?  Capacitance: 1.3pF  (hidden comment: *)
Capacitor, Ceramic (MLCC), 1.3pF, 50V, NP0, SMD 0402; Manufacturer: YAGEO; Manufacturer Part Number: CC0402BRNPO9BN1R3; Package Size: 0402; JLCPCB Basic Part: No; JLCPCB Part Number: C327229; Supplier 1: LCSC; Category: Capacitors - MLCC; Supplier Part Number 1: C327229; Voltage Rating: 50V; Temperature Coefficient: NP0; RoHS: Yes; ComponentLink1Description: Datasheet; ComponentLink1URL: https://wmsc.lcsc.com/wmsc/upload/file/pdf/v2/lcsc/1811141225_YAGEO-CC0402BRNPO9BN1R3_C327229.pdf; ComponentLink2Description: JLCPCB Part URL; ComponentLink2URL: https://jlcpcb.com/partdetail/C327229; ComponentLink3Description: LCSC Part URL; ComponentLink3URL: https://lcsc.com/product-detail/Multilayer-Ceramic-Capacitors-MLCC---SMD-SMT_YAGEO-YAGEO-CC0402BRNPO9BN1R3_C327229.html
footprint CAP-0402 (0402 (1005M) Capacitor)
pins: 1, 2

## CC0402BRNPO9BN1R5
designator C?  Capacitance: 1.5pF  (hidden comment: *)
Capacitor, Ceramic (MLCC), 1.5pF, 50V, NP0, SMD 0402; Manufacturer: YAGEO; Manufacturer Part Number: CC0402BRNPO9BN1R5; Package Size: 0402; JLCPCB Basic Part: No; JLCPCB Part Number: C282238; Supplier 1: LCSC; Category: Capacitors - MLCC; Supplier Part Number 1: C282238; Voltage Rating: 50V; Temperature Coefficient: NP0; RoHS: Yes; ComponentLink1Description: Datasheet; ComponentLink1URL: https://wmsc.lcsc.com/wmsc/upload/file/pdf/v2/lcsc/2304140030_YAGEO-CC0402BRNPO9BN1R5_C282238.pdf; ComponentLink2Description: JLCPCB Part URL; ComponentLink2URL: https://jlcpcb.com/partdetail/C282238; ComponentLink3Description: LCSC Part URL; ComponentLink3URL: https://lcsc.com/product-detail/Multilayer-Ceramic-Capacitors-MLCC---SMD-SMT_YAGEO-YAGEO-CC0402BRNPO9BN1R5_C282238.html
footprint CAP-0402 (0402 (1005M) Capacitor)
pins: 1, 2

## CC0402BRNPO9BN1R6
designator C?  Capacitance: 1.6pF  (hidden comment: *)
Capacitor, Ceramic (MLCC), 1.6pF, 50V, NP0, SMD 0402; Manufacturer: YAGEO; Manufacturer Part Number: CC0402BRNPO9BN1R6; Package Size: 0402; JLCPCB Basic Part: No; JLCPCB Part Number: C541333; Supplier 1: LCSC; Category: Capacitors - MLCC; Supplier Part Number 1: C541333; Voltage Rating: 50V; Temperature Coefficient: NP0; RoHS: Yes; ComponentLink1Description: Datasheet; ComponentLink1URL: https://wmsc.lcsc.com/wmsc/upload/file/pdf/v2/lcsc/2006151111_YAGEO-CC0402BRNPO9BN1R6_C541333.pdf; ComponentLink2Description: JLCPCB Part URL; ComponentLink2URL: https://jlcpcb.com/partdetail/C541333; ComponentLink3Description: LCSC Part URL; ComponentLink3URL: https://lcsc.com/product-detail/Multilayer-Ceramic-Capacitors-MLCC---SMD-SMT_YAGEO-YAGEO-CC0402BRNPO9BN1R6_C541333.html
footprint CAP-0402 (0402 (1005M) Capacitor)
pins: 1, 2

## CC0402BRNPO9BN1R8
designator C?  Capacitance: 1.8pF  (hidden comment: *)
Capacitor, Ceramic (MLCC), 1.8pF, 50V, NP0, SMD 0402; Manufacturer: YAGEO; Manufacturer Part Number: CC0402BRNPO9BN1R8; Package Size: 0402; JLCPCB Basic Part: No; JLCPCB Part Number: C327209; Supplier 1: LCSC; Category: Capacitors - MLCC; Supplier Part Number 1: C327209; Voltage Rating: 50V; Temperature Coefficient: NP0; RoHS: Yes; ComponentLink1Description: Datasheet; ComponentLink1URL: https://wmsc.lcsc.com/wmsc/upload/file/pdf/v2/lcsc/1811141242_YAGEO-CC0402BRNPO9BN1R8_C327209.pdf; ComponentLink2Description: JLCPCB Part URL; ComponentLink2URL: https://jlcpcb.com/partdetail/C327209; ComponentLink3Description: LCSC Part URL; ComponentLink3URL: https://lcsc.com/product-detail/Multilayer-Ceramic-Capacitors-MLCC---SMD-SMT_YAGEO-YAGEO-CC0402BRNPO9BN1R8_C327209.html
footprint CAP-0402 (0402 (1005M) Capacitor)
pins: 1, 2

## CC0402BRNPO9BN2R0
designator C?  Capacitance: 2pF  (hidden comment: *)
Capacitor, Ceramic (MLCC), 2pF, 50V, NP0, SMD 0402; Manufacturer: YAGEO; Manufacturer Part Number: CC0402BRNPO9BN2R0; Package Size: 0402; JLCPCB Basic Part: No; JLCPCB Part Number: C281756; Supplier 1: LCSC; Category: Capacitors - MLCC; Supplier Part Number 1: C281756; Voltage Rating: 50V; Temperature Coefficient: NP0; RoHS: Yes; ComponentLink1Description: Datasheet; ComponentLink1URL: https://wmsc.lcsc.com/wmsc/upload/file/pdf/v2/lcsc/2304140030_YAGEO-CC0402BRNPO9BN2R0_C281756.pdf; ComponentLink2Description: JLCPCB Part URL; ComponentLink2URL: https://jlcpcb.com/partdetail/C281756; ComponentLink3Description: LCSC Part URL; ComponentLink3URL: https://lcsc.com/product-detail/Multilayer-Ceramic-Capacitors-MLCC---SMD-SMT_YAGEO-YAGEO-CC0402BRNPO9BN2R0_C281756.html
footprint CAP-0402 (0402 (1005M) Capacitor)
pins: 1, 2

## CC0402BRNPO9BN2R2
designator C?  Capacitance: 2.2pF  (hidden comment: *)
Capacitor, Ceramic (MLCC), 2.2pF, 50V, NP0, SMD 0402; Manufacturer: YAGEO; Manufacturer Part Number: CC0402BRNPO9BN2R2; Package Size: 0402; JLCPCB Basic Part: No; JLCPCB Part Number: C325452; Supplier 1: LCSC; Category: Capacitors - MLCC; Supplier Part Number 1: C325452; Voltage Rating: 50V; Temperature Coefficient: NP0; RoHS: Yes; ComponentLink1Description: Datasheet; ComponentLink1URL: https://wmsc.lcsc.com/wmsc/upload/file/pdf/v2/lcsc/1811070918_YAGEO-CC0402BRNPO9BN2R2_C325452.pdf; ComponentLink2Description: JLCPCB Part URL; ComponentLink2URL: https://jlcpcb.com/partdetail/C325452; ComponentLink3Description: LCSC Part URL; ComponentLink3URL: https://lcsc.com/product-detail/Multilayer-Ceramic-Capacitors-MLCC---SMD-SMT_YAGEO-YAGEO-CC0402BRNPO9BN2R2_C325452.html
footprint CAP-0402 (0402 (1005M) Capacitor)
pins: 1, 2

## CC0402BRNPO9BN2R4
designator C?  Capacitance: 2.4pF  (hidden comment: *)
Capacitor, Ceramic (MLCC), 2.4pF, 50V, NP0, SMD 0402; Manufacturer: YAGEO; Manufacturer Part Number: CC0402BRNPO9BN2R4; Package Size: 0402; JLCPCB Basic Part: No; JLCPCB Part Number: C541334; Supplier 1: LCSC; Category: Capacitors - MLCC; Supplier Part Number 1: C541334; Voltage Rating: 50V; Temperature Coefficient: NP0; RoHS: Yes; ComponentLink1Description: Datasheet; ComponentLink1URL: https://wmsc.lcsc.com/wmsc/upload/file/pdf/v2/lcsc/2006151111_YAGEO-CC0402BRNPO9BN2R4_C541334.pdf; ComponentLink2Description: JLCPCB Part URL; ComponentLink2URL: https://jlcpcb.com/partdetail/C541334; ComponentLink3Description: LCSC Part URL; ComponentLink3URL: https://lcsc.com/product-detail/Multilayer-Ceramic-Capacitors-MLCC---SMD-SMT_YAGEO-YAGEO-CC0402BRNPO9BN2R4_C541334.html
footprint CAP-0402 (0402 (1005M) Capacitor)
pins: 1, 2

## CC0402BRNPO9BN2R5
designator C?  Capacitance: 2.5pF  (hidden comment: *)
Capacitor, Ceramic (MLCC), 2.5pF, 50V, NP0, SMD 0402; Manufacturer: YAGEO; Manufacturer Part Number: CC0402BRNPO9BN2R5; Package Size: 0402; JLCPCB Basic Part: No; JLCPCB Part Number: C541335; Supplier 1: LCSC; Category: Capacitors - MLCC; Supplier Part Number 1: C541335; Voltage Rating: 50V; Temperature Coefficient: NP0; RoHS: Yes; ComponentLink1Description: Datasheet; ComponentLink1URL: https://wmsc.lcsc.com/wmsc/upload/file/pdf/v2/lcsc/2006151111_YAGEO-CC0402BRNPO9BN2R5_C541335.pdf; ComponentLink2Description: JLCPCB Part URL; ComponentLink2URL: https://jlcpcb.com/partdetail/C541335; ComponentLink3Description: LCSC Part URL; ComponentLink3URL: https://lcsc.com/product-detail/Multilayer-Ceramic-Capacitors-MLCC---SMD-SMT_YAGEO-YAGEO-CC0402BRNPO9BN2R5_C541335.html
footprint CAP-0402 (0402 (1005M) Capacitor)
pins: 1, 2

## CC0402BRNPO9BN2R7
designator C?  Capacitance: 2.7pF  (hidden comment: *)
Capacitor, Ceramic (MLCC), 2.7pF, 50V, NP0, SMD 0402; Manufacturer: YAGEO; Manufacturer Part Number: CC0402BRNPO9BN2R7; Package Size: 0402; JLCPCB Basic Part: No; JLCPCB Part Number: C326937; Supplier 1: LCSC; Category: Capacitors - MLCC; Supplier Part Number 1: C326937; Voltage Rating: 50V; Temperature Coefficient: NP0; RoHS: Yes; ComponentLink1Description: Datasheet; ComponentLink1URL: https://wmsc.lcsc.com/wmsc/upload/file/pdf/v2/lcsc/1811061214_YAGEO-CC0402BRNPO9BN2R7_C326937.pdf; ComponentLink2Description: JLCPCB Part URL; ComponentLink2URL: https://jlcpcb.com/partdetail/C326937; ComponentLink3Description: LCSC Part URL; ComponentLink3URL: https://lcsc.com/product-detail/Multilayer-Ceramic-Capacitors-MLCC---SMD-SMT_YAGEO-YAGEO-CC0402BRNPO9BN2R7_C326937.html
footprint CAP-0402 (0402 (1005M) Capacitor)
pins: 1, 2

## CC0402BRNPO9BN2R8
designator C?  Capacitance: 2.8pF  (hidden comment: *)
Capacitor, Ceramic (MLCC), 2.8pF, 50V, NP0, SMD 0402; Manufacturer: YAGEO; Manufacturer Part Number: CC0402BRNPO9BN2R8; Package Size: 0402; JLCPCB Basic Part: No; JLCPCB Part Number: C1853353; Supplier 1: LCSC; Category: Capacitors - MLCC; Supplier Part Number 1: C1853353; Voltage Rating: 50V; Temperature Coefficient: NP0; RoHS: Yes; ComponentLink1Description: Datasheet; ComponentLink1URL: https://wmsc.lcsc.com/wmsc/upload/file/pdf/v2/lcsc/2202151130_YAGEO-CC0402BRNPO9BN2R8_C1853353.pdf; ComponentLink2Description: JLCPCB Part URL; ComponentLink2URL: https://jlcpcb.com/partdetail/C1853353; ComponentLink3Description: LCSC Part URL; ComponentLink3URL: https://lcsc.com/product-detail/Multilayer-Ceramic-Capacitors-MLCC---SMD-SMT_YAGEO-YAGEO-CC0402BRNPO9BN2R8_C1853353.html
footprint CAP-0402 (0402 (1005M) Capacitor)
pins: 1, 2

## CC0402BRNPO9BN3R0
designator C?  Capacitance: 3pF  (hidden comment: *)
Capacitor, Ceramic (MLCC), 3pF, 50V, NP0, SMD 0402; Manufacturer: YAGEO; Manufacturer Part Number: CC0402BRNPO9BN3R0; Package Size: 0402; JLCPCB Basic Part: No; JLCPCB Part Number: C327228; Supplier 1: LCSC; Category: Capacitors - MLCC; Supplier Part Number 1: C327228; Voltage Rating: 50V; Temperature Coefficient: NP0; RoHS: Yes; ComponentLink1Description: Datasheet; ComponentLink1URL: https://wmsc.lcsc.com/wmsc/upload/file/pdf/v2/lcsc/1811141233_YAGEO-CC0402BRNPO9BN3R0_C327228.pdf; ComponentLink2Description: JLCPCB Part URL; ComponentLink2URL: https://jlcpcb.com/partdetail/C327228; ComponentLink3Description: LCSC Part URL; ComponentLink3URL: https://lcsc.com/product-detail/Multilayer-Ceramic-Capacitors-MLCC---SMD-SMT_YAGEO-YAGEO-CC0402BRNPO9BN3R0_C327228.html
footprint CAP-0402 (0402 (1005M) Capacitor)
pins: 1, 2

## CC0402BRNPO9BN3R3
designator C?  Capacitance: 3.3pF  (hidden comment: *)
Capacitor, Ceramic (MLCC), 3.3pF, 50V, NP0, SMD 0402; Manufacturer: YAGEO; Manufacturer Part Number: CC0402BRNPO9BN3R3; Package Size: 0402; JLCPCB Basic Part: No; JLCPCB Part Number: C327287; Supplier 1: LCSC; Category: Capacitors - MLCC; Supplier Part Number 1: C327287; Voltage Rating: 50V; Temperature Coefficient: NP0; RoHS: Yes; ComponentLink1Description: Datasheet; ComponentLink1URL: https://wmsc.lcsc.com/wmsc/upload/file/pdf/v2/lcsc/1912111437_YAGEO-CC0402BRNPO9BN3R3_C327287.pdf; ComponentLink2Description: JLCPCB Part URL; ComponentLink2URL: https://jlcpcb.com/partdetail/C327287; ComponentLink3Description: LCSC Part URL; ComponentLink3URL: https://lcsc.com/product-detail/Multilayer-Ceramic-Capacitors-MLCC---SMD-SMT_YAGEO-YAGEO-CC0402BRNPO9BN3R3_C327287.html
footprint CAP-0402 (0402 (1005M) Capacitor)
pins: 1, 2

## CC0402BRNPO9BN3R6
designator C?  Capacitance: 3.6pF  (hidden comment: *)
Capacitor, Ceramic (MLCC), 3.6pF, 50V, NP0, SMD 0402; Manufacturer: YAGEO; Manufacturer Part Number: CC0402BRNPO9BN3R6; Package Size: 0402; JLCPCB Basic Part: No; JLCPCB Part Number: C541336; Supplier 1: LCSC; Category: Capacitors - MLCC; Supplier Part Number 1: C541336; Voltage Rating: 50V; Temperature Coefficient: NP0; RoHS: Yes; ComponentLink1Description: Datasheet; ComponentLink1URL: https://wmsc.lcsc.com/wmsc/upload/file/pdf/v2/lcsc/2006151111_YAGEO-CC0402BRNPO9BN3R6_C541336.pdf; ComponentLink2Description: JLCPCB Part URL; ComponentLink2URL: https://jlcpcb.com/partdetail/C541336; ComponentLink3Description: LCSC Part URL; ComponentLink3URL: https://lcsc.com/product-detail/Multilayer-Ceramic-Capacitors-MLCC---SMD-SMT_YAGEO-YAGEO-CC0402BRNPO9BN3R6_C541336.html
footprint CAP-0402 (0402 (1005M) Capacitor)
pins: 1, 2

## CC0402BRNPO9BN3R9
designator C?  Capacitance: 3.9pF  (hidden comment: *)
Capacitor, Ceramic (MLCC), 3.9pF, 50V, NP0, SMD 0402; Manufacturer: YAGEO; Manufacturer Part Number: CC0402BRNPO9BN3R9; Package Size: 0402; JLCPCB Basic Part: No; JLCPCB Part Number: C505474; Supplier 1: LCSC; Category: Capacitors - MLCC; Supplier Part Number 1: C505474; Voltage Rating: 50V; Temperature Coefficient: NP0; RoHS: Yes; ComponentLink1Description: Datasheet; ComponentLink1URL: https://wmsc.lcsc.com/wmsc/upload/file/pdf/v2/lcsc/2304140030_YAGEO-CC0402BRNPO9BN3R9_C505474.pdf; ComponentLink2Description: JLCPCB Part URL; ComponentLink2URL: https://jlcpcb.com/partdetail/C505474; ComponentLink3Description: LCSC Part URL; ComponentLink3URL: https://lcsc.com/product-detail/Multilayer-Ceramic-Capacitors-MLCC---SMD-SMT_YAGEO-YAGEO-CC0402BRNPO9BN3R9_C505474.html
footprint CAP-0402 (0402 (1005M) Capacitor)
pins: 1, 2
